# Altium schematic symbol library Connector_Generic_MountingPin.SchLib: 274 symbols (part 2 of 5)
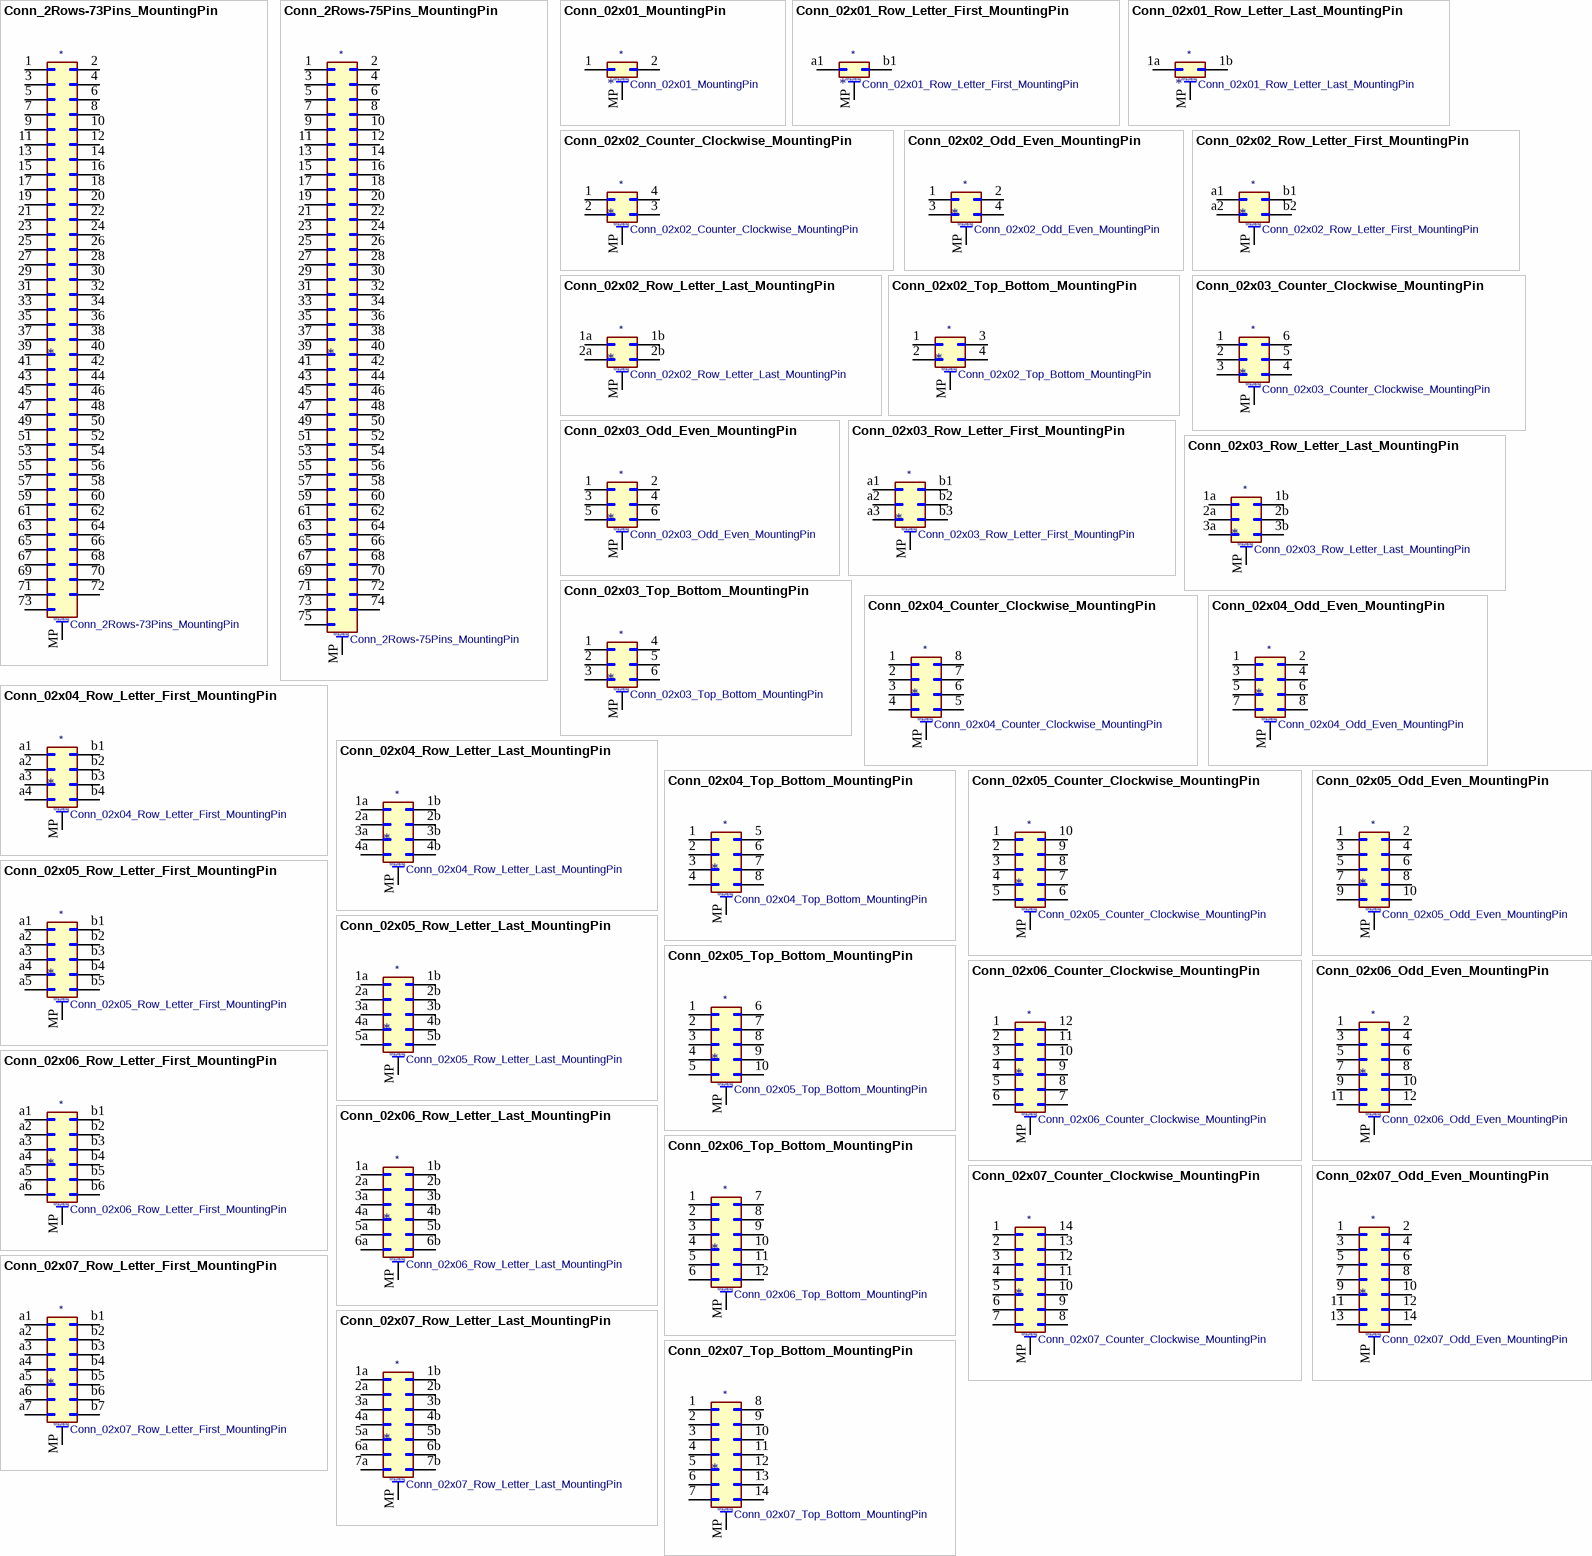
[diagram p17: symbols Conn_2Rows-73Pins_MountingPin to Conn_02x07_Top_Bottom_MountingPin]

## Conn_2Rows-75Pins_MountingPin
designator *  value Conn_2Rows-75Pins_MountingPin
ki_keywords: connector; ki_description: Generic connectable mounting pin connector, double row, 75 pins, odd/even pin numbering scheme (row 1 odd numbers, row 2 even numbers), script generated (kicad-library-utils/schlib/autogen/connector/); ki_fp_filters: Connector*:*2Rows*Pins-1MP_* *FCC*2Rows*Pins-1MP_*; Supplier: ~
pins: 1 Pin_1, 2 Pin_2, 3 Pin_3, 4 Pin_4, 5 Pin_5, 6 Pin_6, 7 Pin_7, 8 Pin_8, 9 Pin_9, 10 Pin_10, 11 Pin_11, 12 Pin_12, 13 Pin_13, 14 Pin_14, 15 Pin_15, 16 Pin_16, 17 Pin_17, 18 Pin_18, 19 Pin_19, 20 Pin_20, 21 Pin_21, 22 Pin_22, 23 Pin_23, 24 Pin_24, 25 Pin_25, 26 Pin_26, 27 Pin_27, 28 Pin_28, 29 Pin_29, 30 Pin_30, 31 Pin_31, 32 Pin_32, 33 Pin_33, 34 Pin_34, 35 Pin_35, 36 Pin_36, 37 Pin_37, 38 Pin_38, 39 Pin_39, 40 Pin_40, 41 Pin_41, 42 Pin_42, 43 Pin_43, 44 Pin_44, 45 Pin_45, 46 Pin_46, 47 Pin_47, 48 Pin_48, 49 Pin_49, 50 Pin_50, 51 Pin_51, 52 Pin_52, 53 Pin_53, 54 Pin_54, 55 Pin_55, 56 Pin_56, 57 Pin_57, 58 Pin_58, 59 Pin_59, 60 Pin_60, 61 Pin_61, 62 Pin_62, 63 Pin_63, 64 Pin_64, 65 Pin_65, 66 Pin_66, 67 Pin_67, 68 Pin_68, 69 Pin_69, 70 Pin_70, 71 Pin_71, 72 Pin_72, 73 Pin_73, 74 Pin_74, 75 Pin_75, MP MountPin
text: Mounting

## Conn_02x01_MountingPin
designator *  value Conn_02x01_MountingPin
ki_keywords: connector; ki_description: Generic connectable mounting pin connector, double row, 02x01, this symbol is compatible with counter-clockwise, top-bottom and odd-even numbering schemes., script generated (kicad-library-utils/schlib/autogen/connector/); ki_fp_filters: Connector*:*_2x??-1MP*; Supplier: ~
pins: 1 Pin_1, 2 Pin_2, MP MountPin
text: Mounting

## Conn_02x01_Row_Letter_First_MountingPin
designator *  value Conn_02x01_Row_Letter_First_MountingPin
ki_keywords: connector; ki_description: Generic connectable mounting pin connector, double row, 02x01, row letter first pin numbering scheme (pin number consists of a letter for the row and a number for the pin index in this row. a1, ..., aN; b1, ..., bN), script generated (kicad-library-utils/schlib/autogen/connector/); ki_fp_filters: Connector*:*_2x??-1MP*; Supplier: ~
pins: a1 Pin_a1, b1 Pin_b1, MP MountPin
text: Mounting

## Conn_02x01_Row_Letter_Last_MountingPin
designator *  value Conn_02x01_Row_Letter_Last_MountingPin
ki_keywords: connector; ki_description: Generic connectable mounting pin connector, double row, 02x01, row letter last pin numbering scheme (pin number consists of a letter for the row and a number for the pin index in this row. 1a, ..., Na; 1b, ..., Nb)), script generated (kicad-library-utils/schlib/autogen/connector/); ki_fp_filters: Connector*:*_2x??-1MP*; Supplier: ~
pins: 1a Pin_1a, 1b Pin_1b, MP MountPin
text: Mounting

## Conn_02x02_Counter_Clockwise_MountingPin
designator *  value Conn_02x02_Counter_Clockwise_MountingPin
ki_keywords: connector; ki_description: Generic connectable mounting pin connector, double row, 02x02, counter clockwise pin numbering scheme (similar to DIP package numbering), script generated (kicad-library-utils/schlib/autogen/connector/); ki_fp_filters: Connector*:*_2x??-1MP*; Supplier: ~
pins: 1 Pin_1, 2 Pin_2, 3 Pin_3, 4 Pin_4, MP MountPin
text: Mounting

## Conn_02x02_Odd_Even_MountingPin
designator *  value Conn_02x02_Odd_Even_MountingPin
ki_keywords: connector; ki_description: Generic connectable mounting pin connector, double row, 02x02, odd/even pin numbering scheme (row 1 odd numbers, row 2 even numbers), script generated (kicad-library-utils/schlib/autogen/connector/); ki_fp_filters: Connector*:*_2x??-1MP*; Supplier: ~
pins: 1 Pin_1, 2 Pin_2, 3 Pin_3, 4 Pin_4, MP MountPin
text: Mounting

## Conn_02x02_Row_Letter_First_MountingPin
designator *  value Conn_02x02_Row_Letter_First_MountingPin
ki_keywords: connector; ki_description: Generic connectable mounting pin connector, double row, 02x02, row letter first pin numbering scheme (pin number consists of a letter for the row and a number for the pin index in this row. a1, ..., aN; b1, ..., bN), script generated (kicad-library-utils/schlib/autogen/connector/); ki_fp_filters: Connector*:*_2x??-1MP*; Supplier: ~
pins: a1 Pin_a1, a2 Pin_a2, b1 Pin_b1, b2 Pin_b2, MP MountPin
text: Mounting

## Conn_02x02_Row_Letter_Last_MountingPin
designator *  value Conn_02x02_Row_Letter_Last_MountingPin
ki_keywords: connector; ki_description: Generic connectable mounting pin connector, double row, 02x02, row letter last pin numbering scheme (pin number consists of a letter for the row and a number for the pin index in this row. 1a, ..., Na; 1b, ..., Nb)), script generated (kicad-library-utils/schlib/autogen/connector/); ki_fp_filters: Connector*:*_2x??-1MP*; Supplier: ~
pins: 1a Pin_1a, 1b Pin_1b, 2a Pin_2a, 2b Pin_2b, MP MountPin
text: Mounting

## Conn_02x02_Top_Bottom_MountingPin
designator *  value Conn_02x02_Top_Bottom_MountingPin
ki_keywords: connector; ki_description: Generic connectable mounting pin connector, double row, 02x02, top/bottom pin numbering scheme (row 1: 1...pins_per_row, row2: pins_per_row+1 ... num_pins), script generated (kicad-library-utils/schlib/autogen/connector/); ki_fp_filters: Connector*:*_2x??-1MP*; Supplier: ~
pins: 1 Pin_1, 2 Pin_2, 3 Pin_3, 4 Pin_4, MP MountPin
text: Mounting

## Conn_02x03_Counter_Clockwise_MountingPin
designator *  value Conn_02x03_Counter_Clockwise_MountingPin
ki_keywords: connector; ki_description: Generic connectable mounting pin connector, double row, 02x03, counter clockwise pin numbering scheme (similar to DIP package numbering), script generated (kicad-library-utils/schlib/autogen/connector/); ki_fp_filters: Connector*:*_2x??-1MP*; Supplier: ~
pins: 1 Pin_1, 2 Pin_2, 3 Pin_3, 4 Pin_4, 5 Pin_5, 6 Pin_6, MP MountPin
text: Mounting

## Conn_02x03_Odd_Even_MountingPin
designator *  value Conn_02x03_Odd_Even_MountingPin
ki_keywords: connector; ki_description: Generic connectable mounting pin connector, double row, 02x03, odd/even pin numbering scheme (row 1 odd numbers, row 2 even numbers), script generated (kicad-library-utils/schlib/autogen/connector/); ki_fp_filters: Connector*:*_2x??-1MP*; Supplier: ~
pins: 1 Pin_1, 2 Pin_2, 3 Pin_3, 4 Pin_4, 5 Pin_5, 6 Pin_6, MP MountPin
text: Mounting

## Conn_02x03_Row_Letter_First_MountingPin
designator *  value Conn_02x03_Row_Letter_First_MountingPin
ki_keywords: connector; ki_description: Generic connectable mounting pin connector, double row, 02x03, row letter first pin numbering scheme (pin number consists of a letter for the row and a number for the pin index in this row. a1, ..., aN; b1, ..., bN), script generated (kicad-library-utils/schlib/autogen/connector/); ki_fp_filters: Connector*:*_2x??-1MP*; Supplier: ~
pins: a1 Pin_a1, a2 Pin_a2, a3 Pin_a3, b1 Pin_b1, b2 Pin_b2, b3 Pin_b3, MP MountPin
text: Mounting

## Conn_02x03_Row_Letter_Last_MountingPin
designator *  value Conn_02x03_Row_Letter_Last_MountingPin
ki_keywords: connector; ki_description: Generic connectable mounting pin connector, double row, 02x03, row letter last pin numbering scheme (pin number consists of a letter for the row and a number for the pin index in this row. 1a, ..., Na; 1b, ..., Nb)), script generated (kicad-library-utils/schlib/autogen/connector/); ki_fp_filters: Connector*:*_2x??-1MP*; Supplier: ~
pins: 1a Pin_1a, 1b Pin_1b, 2a Pin_2a, 2b Pin_2b, 3a Pin_3a, 3b Pin_3b, MP MountPin
text: Mounting

## Conn_02x03_Top_Bottom_MountingPin
designator *  value Conn_02x03_Top_Bottom_MountingPin
ki_keywords: connector; ki_description: Generic connectable mounting pin connector, double row, 02x03, top/bottom pin numbering scheme (row 1: 1...pins_per_row, row2: pins_per_row+1 ... num_pins), script generated (kicad-library-utils/schlib/autogen/connector/); ki_fp_filters: Connector*:*_2x??-1MP*; Supplier: ~
pins: 1 Pin_1, 2 Pin_2, 3 Pin_3, 4 Pin_4, 5 Pin_5, 6 Pin_6, MP MountPin
text: Mounting

## Conn_02x04_Counter_Clockwise_MountingPin
designator *  value Conn_02x04_Counter_Clockwise_MountingPin
ki_keywords: connector; ki_description: Generic connectable mounting pin connector, double row, 02x04, counter clockwise pin numbering scheme (similar to DIP package numbering), script generated (kicad-library-utils/schlib/autogen/connector/); ki_fp_filters: Connector*:*_2x??-1MP*; Supplier: ~
pins: 1 Pin_1, 2 Pin_2, 3 Pin_3, 4 Pin_4, 5 Pin_5, 6 Pin_6, 7 Pin_7, 8 Pin_8, MP MountPin
text: Mounting

## Conn_02x04_Odd_Even_MountingPin
designator *  value Conn_02x04_Odd_Even_MountingPin
ki_keywords: connector; ki_description: Generic connectable mounting pin connector, double row, 02x04, odd/even pin numbering scheme (row 1 odd numbers, row 2 even numbers), script generated (kicad-library-utils/schlib/autogen/connector/); ki_fp_filters: Connector*:*_2x??-1MP*; Supplier: ~
pins: 1 Pin_1, 2 Pin_2, 3 Pin_3, 4 Pin_4, 5 Pin_5, 6 Pin_6, 7 Pin_7, 8 Pin_8, MP MountPin
text: Mounting

## Conn_02x04_Row_Letter_First_MountingPin
designator *  value Conn_02x04_Row_Letter_First_MountingPin
ki_keywords: connector; ki_description: Generic connectable mounting pin connector, double row, 02x04, row letter first pin numbering scheme (pin number consists of a letter for the row and a number for the pin index in this row. a1, ..., aN; b1, ..., bN), script generated (kicad-library-utils/schlib/autogen/connector/); ki_fp_filters: Connector*:*_2x??-1MP*; Supplier: ~
pins: a1 Pin_a1, a2 Pin_a2, a3 Pin_a3, a4 Pin_a4, b1 Pin_b1, b2 Pin_b2, b3 Pin_b3, b4 Pin_b4, MP MountPin
text: Mounting

## Conn_02x04_Row_Letter_Last_MountingPin
designator *  value Conn_02x04_Row_Letter_Last_MountingPin
ki_keywords: connector; ki_description: Generic connectable mounting pin connector, double row, 02x04, row letter last pin numbering scheme (pin number consists of a letter for the row and a number for the pin index in this row. 1a, ..., Na; 1b, ..., Nb)), script generated (kicad-library-utils/schlib/autogen/connector/); ki_fp_filters: Connector*:*_2x??-1MP*; Supplier: ~
pins: 1a Pin_1a, 1b Pin_1b, 2a Pin_2a, 2b Pin_2b, 3a Pin_3a, 3b Pin_3b, 4a Pin_4a, 4b Pin_4b, MP MountPin
text: Mounting

## Conn_02x04_Top_Bottom_MountingPin
designator *  value Conn_02x04_Top_Bottom_MountingPin
ki_keywords: connector; ki_description: Generic connectable mounting pin connector, double row, 02x04, top/bottom pin numbering scheme (row 1: 1...pins_per_row, row2: pins_per_row+1 ... num_pins), script generated (kicad-library-utils/schlib/autogen/connector/); ki_fp_filters: Connector*:*_2x??-1MP*; Supplier: ~
pins: 1 Pin_1, 2 Pin_2, 3 Pin_3, 4 Pin_4, 5 Pin_5, 6 Pin_6, 7 Pin_7, 8 Pin_8, MP MountPin
text: Mounting

## Conn_02x05_Counter_Clockwise_MountingPin
designator *  value Conn_02x05_Counter_Clockwise_MountingPin
ki_keywords: connector; ki_description: Generic connectable mounting pin connector, double row, 02x05, counter clockwise pin numbering scheme (similar to DIP package numbering), script generated (kicad-library-utils/schlib/autogen/connector/); ki_fp_filters: Connector*:*_2x??-1MP*; Supplier: ~
pins: 1 Pin_1, 2 Pin_2, 3 Pin_3, 4 Pin_4, 5 Pin_5, 6 Pin_6, 7 Pin_7, 8 Pin_8, 9 Pin_9, 10 Pin_10, MP MountPin
text: Mounting

## Conn_02x05_Odd_Even_MountingPin
designator *  value Conn_02x05_Odd_Even_MountingPin
ki_keywords: connector; ki_description: Generic connectable mounting pin connector, double row, 02x05, odd/even pin numbering scheme (row 1 odd numbers, row 2 even numbers), script generated (kicad-library-utils/schlib/autogen/connector/); ki_fp_filters: Connector*:*_2x??-1MP*; Supplier: ~
pins: 1 Pin_1, 2 Pin_2, 3 Pin_3, 4 Pin_4, 5 Pin_5, 6 Pin_6, 7 Pin_7, 8 Pin_8, 9 Pin_9, 10 Pin_10, MP MountPin
text: Mounting

## Conn_02x05_Row_Letter_First_MountingPin
designator *  value Conn_02x05_Row_Letter_First_MountingPin
ki_keywords: connector; ki_description: Generic connectable mounting pin connector, double row, 02x05, row letter first pin numbering scheme (pin number consists of a letter for the row and a number for the pin index in this row. a1, ..., aN; b1, ..., bN), script generated (kicad-library-utils/schlib/autogen/connector/); ki_fp_filters: Connector*:*_2x??-1MP*; Supplier: ~
pins: a1 Pin_a1, a2 Pin_a2, a3 Pin_a3, a4 Pin_a4, a5 Pin_a5, b1 Pin_b1, b2 Pin_b2, b3 Pin_b3, b4 Pin_b4, b5 Pin_b5, MP MountPin
text: Mounting

## Conn_02x05_Row_Letter_Last_MountingPin
designator *  value Conn_02x05_Row_Letter_Last_MountingPin
ki_keywords: connector; ki_description: Generic connectable mounting pin connector, double row, 02x05, row letter last pin numbering scheme (pin number consists of a letter for the row and a number for the pin index in this row. 1a, ..., Na; 1b, ..., Nb)), script generated (kicad-library-utils/schlib/autogen/connector/); ki_fp_filters: Connector*:*_2x??-1MP*; Supplier: ~
pins: 1a Pin_1a, 1b Pin_1b, 2a Pin_2a, 2b Pin_2b, 3a Pin_3a, 3b Pin_3b, 4a Pin_4a, 4b Pin_4b, 5a Pin_5a, 5b Pin_5b, MP MountPin
text: Mounting

## Conn_02x05_Top_Bottom_MountingPin
designator *  value Conn_02x05_Top_Bottom_MountingPin
ki_keywords: connector; ki_description: Generic connectable mounting pin connector, double row, 02x05, top/bottom pin numbering scheme (row 1: 1...pins_per_row, row2: pins_per_row+1 ... num_pins), script generated (kicad-library-utils/schlib/autogen/connector/); ki_fp_filters: Connector*:*_2x??-1MP*; Supplier: ~
pins: 1 Pin_1, 2 Pin_2, 3 Pin_3, 4 Pin_4, 5 Pin_5, 6 Pin_6, 7 Pin_7, 8 Pin_8, 9 Pin_9, 10 Pin_10, MP MountPin
text: Mounting

## Conn_02x06_Counter_Clockwise_MountingPin
designator *  value Conn_02x06_Counter_Clockwise_MountingPin
ki_keywords: connector; ki_description: Generic connectable mounting pin connector, double row, 02x06, counter clockwise pin numbering scheme (similar to DIP package numbering), script generated (kicad-library-utils/schlib/autogen/connector/); ki_fp_filters: Connector*:*_2x??-1MP*; Supplier: ~
pins: 1 Pin_1, 2 Pin_2, 3 Pin_3, 4 Pin_4, 5 Pin_5, 6 Pin_6, 7 Pin_7, 8 Pin_8, 9 Pin_9, 10 Pin_10, 11 Pin_11, 12 Pin_12, MP MountPin
text: Mounting

## Conn_02x06_Odd_Even_MountingPin
designator *  value Conn_02x06_Odd_Even_MountingPin
ki_keywords: connector; ki_description: Generic connectable mounting pin connector, double row, 02x06, odd/even pin numbering scheme (row 1 odd numbers, row 2 even numbers), script generated (kicad-library-utils/schlib/autogen/connector/); ki_fp_filters: Connector*:*_2x??-1MP*; Supplier: ~
pins: 1 Pin_1, 2 Pin_2, 3 Pin_3, 4 Pin_4, 5 Pin_5, 6 Pin_6, 7 Pin_7, 8 Pin_8, 9 Pin_9, 10 Pin_10, 11 Pin_11, 12 Pin_12, MP MountPin
text: Mounting

## Conn_02x06_Row_Letter_First_MountingPin
designator *  value Conn_02x06_Row_Letter_First_MountingPin
ki_keywords: connector; ki_description: Generic connectable mounting pin connector, double row, 02x06, row letter first pin numbering scheme (pin number consists of a letter for the row and a number for the pin index in this row. a1, ..., aN; b1, ..., bN), script generated (kicad-library-utils/schlib/autogen/connector/); ki_fp_filters: Connector*:*_2x??-1MP*; Supplier: ~
pins: a1 Pin_a1, a2 Pin_a2, a3 Pin_a3, a4 Pin_a4, a5 Pin_a5, a6 Pin_a6, b1 Pin_b1, b2 Pin_b2, b3 Pin_b3, b4 Pin_b4, b5 Pin_b5, b6 Pin_b6, MP MountPin
text: Mounting

## Conn_02x06_Row_Letter_Last_MountingPin
designator *  value Conn_02x06_Row_Letter_Last_MountingPin
ki_keywords: connector; ki_description: Generic connectable mounting pin connector, double row, 02x06, row letter last pin numbering scheme (pin number consists of a letter for the row and a number for the pin index in this row. 1a, ..., Na; 1b, ..., Nb)), script generated (kicad-library-utils/schlib/autogen/connector/); ki_fp_filters: Connector*:*_2x??-1MP*; Supplier: ~
pins: 1a Pin_1a, 1b Pin_1b, 2a Pin_2a, 2b Pin_2b, 3a Pin_3a, 3b Pin_3b, 4a Pin_4a, 4b Pin_4b, 5a Pin_5a, 5b Pin_5b, 6a Pin_6a, 6b Pin_6b, MP MountPin
text: Mounting

## Conn_02x06_Top_Bottom_MountingPin
designator *  value Conn_02x06_Top_Bottom_MountingPin
ki_keywords: connector; ki_description: Generic connectable mounting pin connector, double row, 02x06, top/bottom pin numbering scheme (row 1: 1...pins_per_row, row2: pins_per_row+1 ... num_pins), script generated (kicad-library-utils/schlib/autogen/connector/); ki_fp_filters: Connector*:*_2x??-1MP*; Supplier: ~
pins: 1 Pin_1, 2 Pin_2, 3 Pin_3, 4 Pin_4, 5 Pin_5, 6 Pin_6, 7 Pin_7, 8 Pin_8, 9 Pin_9, 10 Pin_10, 11 Pin_11, 12 Pin_12, MP MountPin
text: Mounting

## Conn_02x07_Counter_Clockwise_MountingPin
designator *  value Conn_02x07_Counter_Clockwise_MountingPin
ki_keywords: connector; ki_description: Generic connectable mounting pin connector, double row, 02x07, counter clockwise pin numbering scheme (similar to DIP package numbering), script generated (kicad-library-utils/schlib/autogen/connector/); ki_fp_filters: Connector*:*_2x??-1MP*; Supplier: ~
pins: 1 Pin_1, 2 Pin_2, 3 Pin_3, 4 Pin_4, 5 Pin_5, 6 Pin_6, 7 Pin_7, 8 Pin_8, 9 Pin_9, 10 Pin_10, 11 Pin_11, 12 Pin_12, 13 Pin_13, 14 Pin_14, MP MountPin
text: Mounting

## Conn_02x07_Odd_Even_MountingPin
designator *  value Conn_02x07_Odd_Even_MountingPin
ki_keywords: connector; ki_description: Generic connectable mounting pin connector, double row, 02x07, odd/even pin numbering scheme (row 1 odd numbers, row 2 even numbers), script generated (kicad-library-utils/schlib/autogen/connector/); ki_fp_filters: Connector*:*_2x??-1MP*; Supplier: ~
pins: 1 Pin_1, 2 Pin_2, 3 Pin_3, 4 Pin_4, 5 Pin_5, 6 Pin_6, 7 Pin_7, 8 Pin_8, 9 Pin_9, 10 Pin_10, 11 Pin_11, 12 Pin_12, 13 Pin_13, 14 Pin_14, MP MountPin
text: Mounting

## Conn_02x07_Row_Letter_First_MountingPin
designator *  value Conn_02x07_Row_Letter_First_MountingPin
ki_keywords: connector; ki_description: Generic connectable mounting pin connector, double row, 02x07, row letter first pin numbering scheme (pin number consists of a letter for the row and a number for the pin index in this row. a1, ..., aN; b1, ..., bN), script generated (kicad-library-utils/schlib/autogen/connector/); ki_fp_filters: Connector*:*_2x??-1MP*; Supplier: ~
pins: a1 Pin_a1, a2 Pin_a2, a3 Pin_a3, a4 Pin_a4, a5 Pin_a5, a6 Pin_a6, a7 Pin_a7, b1 Pin_b1, b2 Pin_b2, b3 Pin_b3, b4 Pin_b4, b5 Pin_b5, b6 Pin_b6, b7 Pin_b7, MP MountPin
text: Mounting

## Conn_02x07_Row_Letter_Last_MountingPin
designator *  value Conn_02x07_Row_Letter_Last_MountingPin
ki_keywords: connector; ki_description: Generic connectable mounting pin connector, double row, 02x07, row letter last pin numbering scheme (pin number consists of a letter for the row and a number for the pin index in this row. 1a, ..., Na; 1b, ..., Nb)), script generated (kicad-library-utils/schlib/autogen/connector/); ki_fp_filters: Connector*:*_2x??-1MP*; Supplier: ~
pins: 1a Pin_1a, 1b Pin_1b, 2a Pin_2a, 2b Pin_2b, 3a Pin_3a, 3b Pin_3b, 4a Pin_4a, 4b Pin_4b, 5a Pin_5a, 5b Pin_5b, 6a Pin_6a, 6b Pin_6b, 7a Pin_7a, 7b Pin_7b, MP MountPin
text: Mounting

## Conn_02x07_Top_Bottom_MountingPin
designator *  value Conn_02x07_Top_Bottom_MountingPin
ki_keywords: connector; ki_description: Generic connectable mounting pin connector, double row, 02x07, top/bottom pin numbering scheme (row 1: 1...pins_per_row, row2: pins_per_row+1 ... num_pins), script generated (kicad-library-utils/schlib/autogen/connector/); ki_fp_filters: Connector*:*_2x??-1MP*; Supplier: ~
pins: 1 Pin_1, 2 Pin_2, 3 Pin_3, 4 Pin_4, 5 Pin_5, 6 Pin_6, 7 Pin_7, 8 Pin_8, 9 Pin_9, 10 Pin_10, 11 Pin_11, 12 Pin_12, 13 Pin_13, 14 Pin_14, MP MountPin
text: Mounting

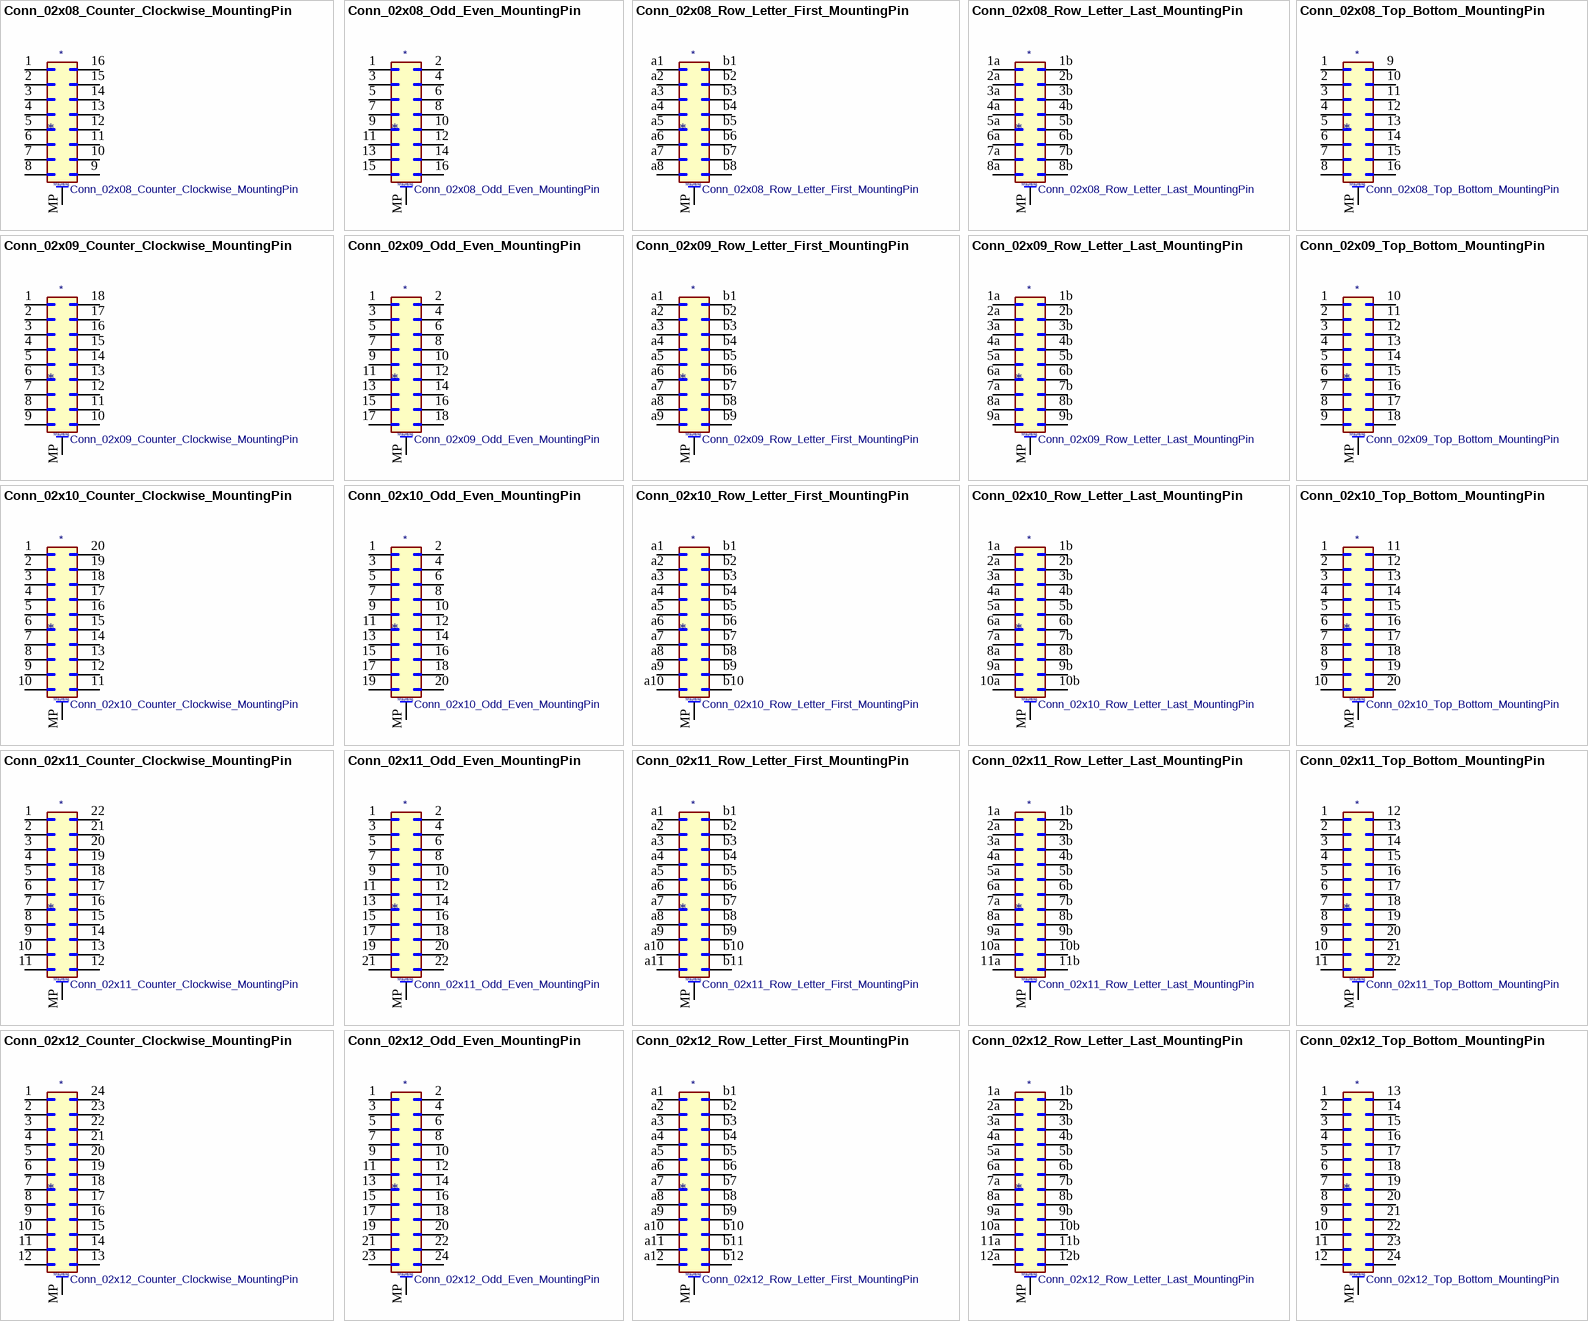
[diagram p5: symbols Conn_02x08_Counter_Clockwise_MountingPin to Conn_02x12_Top_Bottom_MountingPin]

## Conn_02x08_Counter_Clockwise_MountingPin
designator *  value Conn_02x08_Counter_Clockwise_MountingPin
ki_keywords: connector; ki_description: Generic connectable mounting pin connector, double row, 02x08, counter clockwise pin numbering scheme (similar to DIP package numbering), script generated (kicad-library-utils/schlib/autogen/connector/); ki_fp_filters: Connector*:*_2x??-1MP*; Supplier: ~
pins: 1 Pin_1, 2 Pin_2, 3 Pin_3, 4 Pin_4, 5 Pin_5, 6 Pin_6, 7 Pin_7, 8 Pin_8, 9 Pin_9, 10 Pin_10, 11 Pin_11, 12 Pin_12, 13 Pin_13, 14 Pin_14, 15 Pin_15, 16 Pin_16, MP MountPin
text: Mounting

## Conn_02x08_Odd_Even_MountingPin
designator *  value Conn_02x08_Odd_Even_MountingPin
ki_keywords: connector; ki_description: Generic connectable mounting pin connector, double row, 02x08, odd/even pin numbering scheme (row 1 odd numbers, row 2 even numbers), script generated (kicad-library-utils/schlib/autogen/connector/); ki_fp_filters: Connector*:*_2x??-1MP*; Supplier: ~
pins: 1 Pin_1, 2 Pin_2, 3 Pin_3, 4 Pin_4, 5 Pin_5, 6 Pin_6, 7 Pin_7, 8 Pin_8, 9 Pin_9, 10 Pin_10, 11 Pin_11, 12 Pin_12, 13 Pin_13, 14 Pin_14, 15 Pin_15, 16 Pin_16, MP MountPin
text: Mounting

## Conn_02x08_Row_Letter_First_MountingPin
designator *  value Conn_02x08_Row_Letter_First_MountingPin
ki_keywords: connector; ki_description: Generic connectable mounting pin connector, double row, 02x08, row letter first pin numbering scheme (pin number consists of a letter for the row and a number for the pin index in this row. a1, ..., aN; b1, ..., bN), script generated (kicad-library-utils/schlib/autogen/connector/); ki_fp_filters: Connector*:*_2x??-1MP*; Supplier: ~
pins: a1 Pin_a1, a2 Pin_a2, a3 Pin_a3, a4 Pin_a4, a5 Pin_a5, a6 Pin_a6, a7 Pin_a7, a8 Pin_a8, b1 Pin_b1, b2 Pin_b2, b3 Pin_b3, b4 Pin_b4, b5 Pin_b5, b6 Pin_b6, b7 Pin_b7, b8 Pin_b8, MP MountPin
text: Mounting

## Conn_02x08_Row_Letter_Last_MountingPin
designator *  value Conn_02x08_Row_Letter_Last_MountingPin
ki_keywords: connector; ki_description: Generic connectable mounting pin connector, double row, 02x08, row letter last pin numbering scheme (pin number consists of a letter for the row and a number for the pin index in this row. 1a, ..., Na; 1b, ..., Nb)), script generated (kicad-library-utils/schlib/autogen/connector/); ki_fp_filters: Connector*:*_2x??-1MP*; Supplier: ~
pins: 1a Pin_1a, 1b Pin_1b, 2a Pin_2a, 2b Pin_2b, 3a Pin_3a, 3b Pin_3b, 4a Pin_4a, 4b Pin_4b, 5a Pin_5a, 5b Pin_5b, 6a Pin_6a, 6b Pin_6b, 7a Pin_7a, 7b Pin_7b, 8a Pin_8a, 8b Pin_8b, MP MountPin
text: Mounting

## Conn_02x08_Top_Bottom_MountingPin
designator *  value Conn_02x08_Top_Bottom_MountingPin
ki_keywords: connector; ki_description: Generic connectable mounting pin connector, double row, 02x08, top/bottom pin numbering scheme (row 1: 1...pins_per_row, row2: pins_per_row+1 ... num_pins), script generated (kicad-library-utils/schlib/autogen/connector/); ki_fp_filters: Connector*:*_2x??-1MP*; Supplier: ~
pins: 1 Pin_1, 2 Pin_2, 3 Pin_3, 4 Pin_4, 5 Pin_5, 6 Pin_6, 7 Pin_7, 8 Pin_8, 9 Pin_9, 10 Pin_10, 11 Pin_11, 12 Pin_12, 13 Pin_13, 14 Pin_14, 15 Pin_15, 16 Pin_16, MP MountPin
text: Mounting

## Conn_02x09_Counter_Clockwise_MountingPin
designator *  value Conn_02x09_Counter_Clockwise_MountingPin
ki_keywords: connector; ki_description: Generic connectable mounting pin connector, double row, 02x09, counter clockwise pin numbering scheme (similar to DIP package numbering), script generated (kicad-library-utils/schlib/autogen/connector/); ki_fp_filters: Connector*:*_2x??-1MP*; Supplier: ~
pins: 1 Pin_1, 2 Pin_2, 3 Pin_3, 4 Pin_4, 5 Pin_5, 6 Pin_6, 7 Pin_7, 8 Pin_8, 9 Pin_9, 10 Pin_10, 11 Pin_11, 12 Pin_12, 13 Pin_13, 14 Pin_14, 15 Pin_15, 16 Pin_16, 17 Pin_17, 18 Pin_18, MP MountPin
text: Mounting

## Conn_02x09_Odd_Even_MountingPin
designator *  value Conn_02x09_Odd_Even_MountingPin
ki_keywords: connector; ki_description: Generic connectable mounting pin connector, double row, 02x09, odd/even pin numbering scheme (row 1 odd numbers, row 2 even numbers), script generated (kicad-library-utils/schlib/autogen/connector/); ki_fp_filters: Connector*:*_2x??-1MP*; Supplier: ~
pins: 1 Pin_1, 2 Pin_2, 3 Pin_3, 4 Pin_4, 5 Pin_5, 6 Pin_6, 7 Pin_7, 8 Pin_8, 9 Pin_9, 10 Pin_10, 11 Pin_11, 12 Pin_12, 13 Pin_13, 14 Pin_14, 15 Pin_15, 16 Pin_16, 17 Pin_17, 18 Pin_18, MP MountPin
text: Mounting

## Conn_02x09_Row_Letter_First_MountingPin
designator *  value Conn_02x09_Row_Letter_First_MountingPin
ki_keywords: connector; ki_description: Generic connectable mounting pin connector, double row, 02x09, row letter first pin numbering scheme (pin number consists of a letter for the row and a number for the pin index in this row. a1, ..., aN; b1, ..., bN), script generated (kicad-library-utils/schlib/autogen/connector/); ki_fp_filters: Connector*:*_2x??-1MP*; Supplier: ~
pins: a1 Pin_a1, a2 Pin_a2, a3 Pin_a3, a4 Pin_a4, a5 Pin_a5, a6 Pin_a6, a7 Pin_a7, a8 Pin_a8, a9 Pin_a9, b1 Pin_b1, b2 Pin_b2, b3 Pin_b3, b4 Pin_b4, b5 Pin_b5, b6 Pin_b6, b7 Pin_b7, b8 Pin_b8, b9 Pin_b9, MP MountPin
text: Mounting

## Conn_02x09_Row_Letter_Last_MountingPin
designator *  value Conn_02x09_Row_Letter_Last_MountingPin
ki_keywords: connector; ki_description: Generic connectable mounting pin connector, double row, 02x09, row letter last pin numbering scheme (pin number consists of a letter for the row and a number for the pin index in this row. 1a, ..., Na; 1b, ..., Nb)), script generated (kicad-library-utils/schlib/autogen/connector/); ki_fp_filters: Connector*:*_2x??-1MP*; Supplier: ~
pins: 1a Pin_1a, 1b Pin_1b, 2a Pin_2a, 2b Pin_2b, 3a Pin_3a, 3b Pin_3b, 4a Pin_4a, 4b Pin_4b, 5a Pin_5a, 5b Pin_5b, 6a Pin_6a, 6b Pin_6b, 7a Pin_7a, 7b Pin_7b, 8a Pin_8a, 8b Pin_8b, 9a Pin_9a, 9b Pin_9b, MP MountPin
text: Mounting

## Conn_02x09_Top_Bottom_MountingPin
designator *  value Conn_02x09_Top_Bottom_MountingPin
ki_keywords: connector; ki_description: Generic connectable mounting pin connector, double row, 02x09, top/bottom pin numbering scheme (row 1: 1...pins_per_row, row2: pins_per_row+1 ... num_pins), script generated (kicad-library-utils/schlib/autogen/connector/); ki_fp_filters: Connector*:*_2x??-1MP*; Supplier: ~
pins: 1 Pin_1, 2 Pin_2, 3 Pin_3, 4 Pin_4, 5 Pin_5, 6 Pin_6, 7 Pin_7, 8 Pin_8, 9 Pin_9, 10 Pin_10, 11 Pin_11, 12 Pin_12, 13 Pin_13, 14 Pin_14, 15 Pin_15, 16 Pin_16, 17 Pin_17, 18 Pin_18, MP MountPin
text: Mounting
